# Altium footprint library Dart_Controller_Pcblib.PcbLib: 43 footprints (part 3 of 3)
Each footprint in its own frame and in the unit in brackets; x right, y up, seen from the top. Pads: shape width x height; smd on the part's side, far side on the other; paste and mask are expansions set on the pad; w line width, h text height; cw(c..) or ccw(c..) is an arc to the next point about the centre after c.
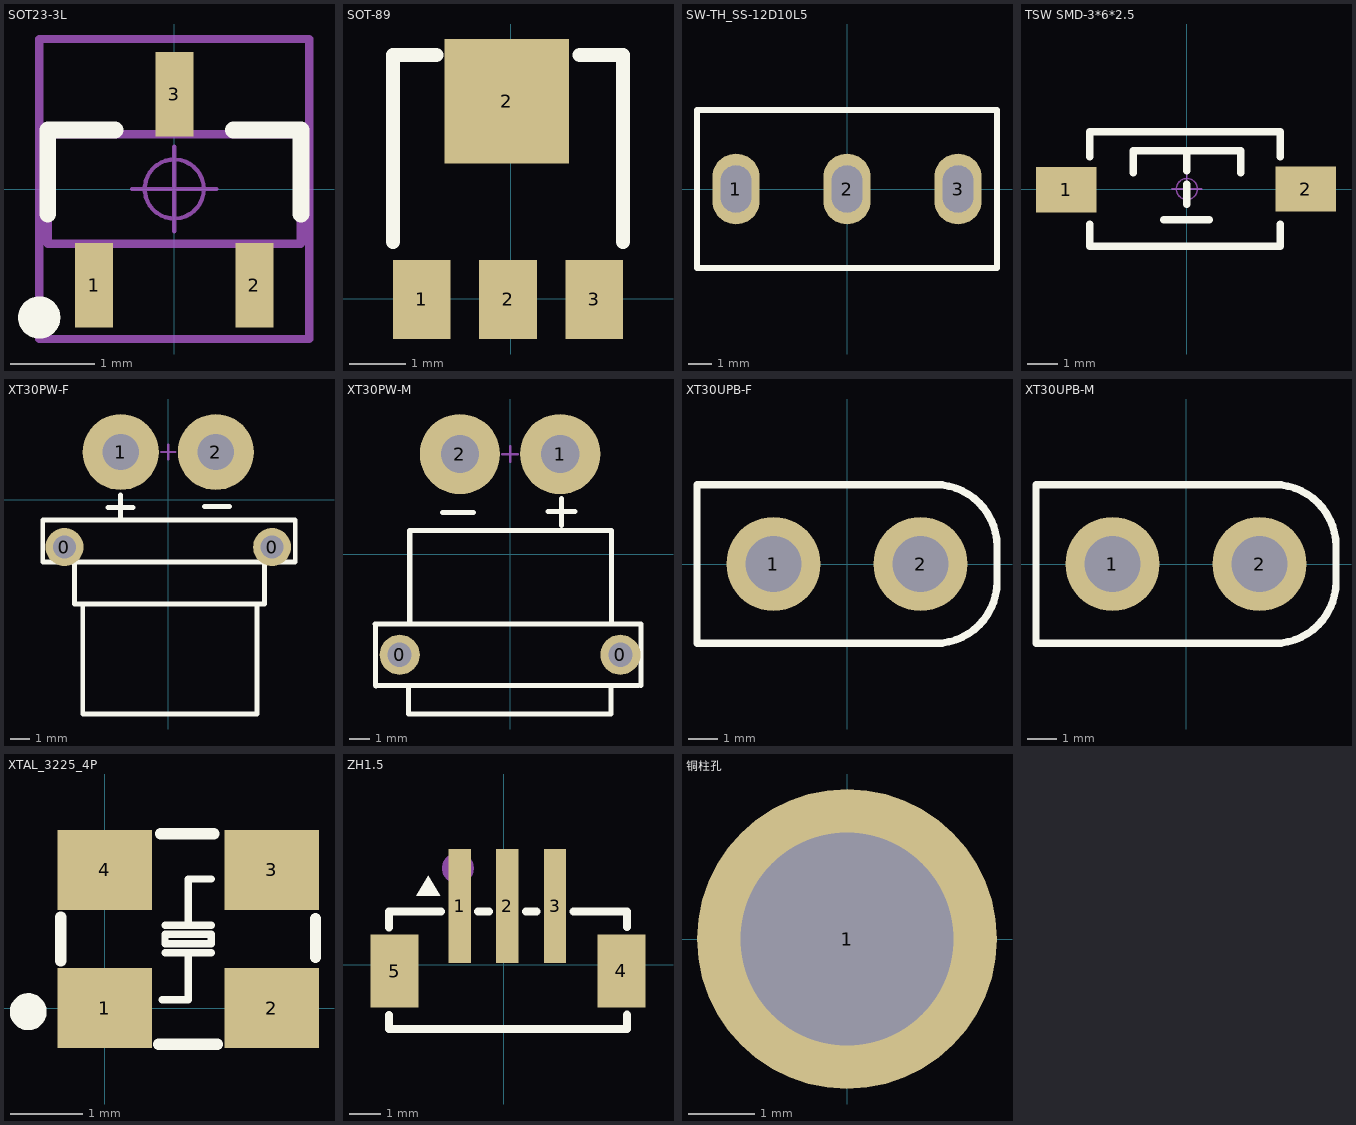
[diagram p2: the footprints below, top view; thin cyan lines are the x and y axes]

## SOT23-3L [mm] "3x1.3x1mm(长宽高)    封装库来自淘宝卖家 ID：黄晶宝石"
height 1.1
pads (3):
  rect 0.45x1 smd: 1(-0.95,-1.143) 2(0.95,-1.143) 3(0,1.125)
Top Overlay:
  circle w0.25: c-1.6,-1.524 r0.125
  lines w0.2: -1.5,-0.3 -1.5,0.7 -0.7,0.7 ; 0.7,0.7 1.5,0.7 1.5,-0.3
Mechanical 13:
  lines w0.1: -1.5,-0.65 1.5,-0.65 1.5,0.65 -1.5,0.65 -1.5,-0.65
Mechanical 15:
  circle w0.05: c0,0 r0.35
  lines w0.05: -0.5,0 0.5,0 ; 0,-0.5 0,0.5
  lines w0.1: -1.6,-1.778 1.6,-1.778 1.6,1.778 -1.6,1.778 -1.6,-1.778
3D body "SOT23-3.STEP": height 1.05, standoff 0, extent -1.5,-1.2 1.5,1.2

## SOT-89 [mil] "封装库来自淘宝卖家 ID：黄晶宝石"
pads (4):
  rect 40x55 smd: 1(-61.82,-0.57) 2(-1.82,-0.57) 3(58.18,-0.57)
  rect 86.61x86.61 smd: 2(-2.76,137.22)
Top Overlay:
  lines w10: -81.82,39.43 -81.82,169.43 -51.82,169.43 ; 48.18,169.43 78.18,169.43 78.18,39.43
3D body "SOT-89.STEP": height 59.45, standoff 0, extent -90.07,-6.45 87.1,162.85

## SW-TH_SS-12D10L5 [mm]
pads (3):
  oval 2x3 hole 1.3 slot 2 at 90 deg paste-2539.97 mask+0.051: 1(-4.7,0) 2(0,0) 3(4.7,0)
Top Overlay:
  lines w0.254: -6.35,-3.35 -6.35,3.35 6.35,3.35 6.35,-3.35 -6.35,-3.35
3D body "SS12_CORR.step": height 10.1, standoff -7, extent -6.5,-3.4 6.501,3.4

## TSW SMD-3*6*2.5 [mm] "3*6*2.5mm"
pads (2):
  rect 2x1.5 smd: 1(-3.996,-0.02) 2(3.937,0)
Top Overlay:
  lines w0.254: -3.212,-1.168 -3.212,-1.9 3.088,-1.9 3.088,-1.168 ; -3.212,1.067 -3.212,1.9 3.088,1.9 3.088,1.067 ; -1.778,0.533 -1.778,1.27 1.778,1.27 1.778,0.533 ; -0.762,-1.016 0.737,-1.016 ; 0,-0.508 0,0.152 ; 0,0.61 0,1.27
Mechanical 15:
  circle w0.05: c0,0 r0.35
  lines w0.05: -0.5,0 0.5,0 ; 0,-0.5 0,0.5
3D body "TSW SMD-3x6x2.5.STEP": height 2.59, standoff -0.03, extent -4,-1.877 4,1.623

## XT30PW-F [mm]
pads (4):
  round 2 hole 1.2: 0(-5.461,-2.5) 0(5.461,-2.5)
  round 4 hole 1.9: 1(-2.5,2.5) 2(2.5,2.5)
Top Overlay:
  lines w0.254: -6.604,-3.277 6.68,-3.277 6.68,-1.067 -6.604,-1.067 -6.604,-3.251 ; -4.928,-3.429 -4.928,-5.486 4.147,-5.486 5.055,-5.486 5.055,-3.454 ; -4.496,-5.512 -4.496,-11.278 4.674,-11.278 4.674,-5.486 ; -3.175,-0.417 -1.854,-0.417 ; -2.515,-1.027 -2.515,0.243 ; 1.905,-0.366 3.226,-0.366
Mechanical 15:
  lines w0.127: -0.381,2.5 0.381,2.5 ; 0,2.119 0,2.881
3D body "User Library-XT30PW-F.STEP": height 5, standoff -2, extent -6.624,-11.35 6.676,3.55

## XT30PW-M [mm]
pads (4):
  round 2 hole 1.2: 0(-5.5,-5) 0(5.5,-5)
  round 4 hole 1.9: 1(2.5,5) 2(-2.5,5)
Top Overlay:
  lines w0.254: -6.731,-3.458 6.502,-3.458 ; -6.706,-3.48 -6.706,-6.528 -6.68,-6.553 ; -6.676,-6.528 6.401,-6.528 ; -5.055,-6.528 -5.055,-7.954 5.029,-7.954 5.029,-6.528 ; -5,-3.429 -5,1.168 -5,1.194 5.055,1.194 5.055,-3.404 ; -3.353,2.083 -1.829,2.083 ; 1.905,2.134 3.226,2.134 ; 2.565,1.448 2.565,1.524 2.565,2.794 ; 6.528,-6.528 6.528,-3.458
Mechanical 15:
  lines w0.127: -0.381,5 0.381,5 ; 0,4.619 0,5.381
3D body "User Library-XT30PW-M.STEP": height 5, standoff -2, extent -6.645,-7.966 6.655,5.984

## XT30UPB-F [mm]
pads (2):
  round 3.2 hole 1.9: 1(-2.5,0) 2(2.5,0)
Top Overlay:
  lines w0.254: -5.1,-2.7 -5.1,2.7 3,2.7 cw(c3,0.6) 5.1,0.6 5.1,-0.6 cw(c3,-0.6) 3,-2.7 -5.1,-2.7
3D body "User Library-XT30UPB-F-1.STEP": height 9.4, standoff -2, extent -5.1,-2.6 5.1,2.6

## XT30UPB-M [mm]
pads (2):
  round 3.2 hole 1.9: 1(-2.5,0) 2(2.5,0)
Top Overlay:
  lines w0.254: -5.1,-2.7 3,-2.7 ccw(c3,-0.6) 5.1,-0.6 5.1,0.6 ccw(c3,0.6) 3,2.7 -5.1,2.7 -5.1,-2.7
3D body "User Library-XT30.step": height 12.6, standoff -2.9, extent -5.2,-2.7 5.2,2.6

## XTAL_3225_4P [mm]
pads (4):
  rect 1.3x1.1 smd: 1(0,0) 2(2.3,0) 3(2.3,1.9) 4(0,1.9)
Top Overlay:
  circle w0.254: c-1.05,-0.05 r0.127
  lines w0.1: 0.833,0.759 1.468,0.76 ; 0.833,1.14 1.468,1.141 ; 1.15,0.112 1.15,0.76 ; 1.15,1.141 1.15,1.775 1.468,1.775 ; 0.833,0.887 0.833,1.014 1.468,1.013 1.468,0.887 0.833,0.887
  lines w0.102: 0.794,0.112 1.15,0.112
  lines w0.152: -0.603,0.645 -0.603,1.255 ; 0.744,-0.498 1.556,-0.498 ; 0.769,2.398 1.506,2.398 ; 2.903,0.696 2.903,1.229
3D body "XTAL-3225.STEP": height 0.8, standoff 0, extent -0.45,-0.295 2.75,2.205

## ZH1.5 [mm]
pads (5):
  rect 0.7x3.6 smd paste+0 mask+0.05: 1(-1.391,1.843) 2(0.109,1.843) 3(1.609,1.843)
  rect 1.5x2.3 smd paste+0 mask+0.05: 4(3.701,-0.198) 5(-3.441,-0.207)
Top Overlay:
  region: -2.376,2.799 -2.757,2.164 -1.995,2.164
  lines w0.254: -3.62,-1.588 -3.62,-2.032 3.88,-2.032 3.88,-1.579 ; -3.62,1.218 -3.62,1.174 -3.62,1.668 -1.972,1.668 ; -0.81,1.668 -0.472,1.668 ; 0.69,1.668 1.028,1.668 ; 2.19,1.668 3.88,1.668 3.88,1.183
Mechanical 15:
  circle w0.5: c-1.446,3.034 r0.25
3D body "ZH1.5_CORR.step": height 5.1, standoff 0, extent -3.623,-2.241 3.877,2.96

## 铜柱孔 [mm]
pads (1):
  round 4.5 hole 3.2 mask+0: 1(0,0)